# Altium integrated library Molex FFC - FPC Connectors (Through-Hole).IntLib: 219 symbols (part 3 of 3) (continued)
## 52806-2310
designator J?
1.0 mm Pitch FFC Connector, 5.4 mm Mated Height, Vertical, Non-ZIF, Through Hole, 23 Circuits, -20 to 80 degC, ELV and RoHS Compliant, Tray; Manufacturer: Molex; PartNumber: 52806-2310; Circuits (Loaded): 23; Current (Max per Contact): 0.5A; Durability (mating cycles max): 10; Mated Height: 5.40mm; Material - Metal: Phosphor Bronze; Material - Plating Mating: Tin; PCB Locator: No; PCB Retention: None; Pitch - Mating Interface: 1.00mm; Voltage (Max): 50V AC (RMS)/DC; PackageVersion: Rev. B, 08/2002; PackageReference: 52806-2310; PackageDescription: 23-Lead FFC Connector, Pitch 1.0 mm; Circuits (maximum): 23; Contact Position: N/A; Entry Angle: Vertical; Material - Plating Termination: Tin; Number of Rows: 1; Orientation: Vertical; Packing: Tray; Pitch - Termination Interface: 1.00mm; Polarized to PCB: No; RoHS: TRUE; Stackable: No; Mounting Technology: Through Hole; ComponentLink1Description: Manufacturer URL; ComponentLink1URL: http://www.molex.com/molex/index.jsp; ComponentLink2Description: Datasheet; ComponentLink2URL: http://www.molex.com/webdocs/datasheets/pdf/en-us/0528062310_FFC_FPC_CONNECTORS.pdf; ComponentLink3Description: Package Specification; ComponentLink3URL: http://www.molex.com/pdm_docs/sd/528062310_sd.pdf
footprint MOLX-52806-2310 (FFC Connector, 23-Leads, Vertical, Pitch 1.0 mm, Mated Height 5.4 mm, Through Hole)
pins: 1, 2, 3, 4, 5, 6, 7, 8, 9, 10, 11, 12, 13, 14, 15, 16, 17, 18, 19, 20, 21, 22, 23

## 52806-2410
designator J?
1.0 mm Pitch FFC Connector, 5.4 mm Mated Height, Vertical, Non-ZIF, Through Hole, 24 Circuits, -20 to 80 degC, ELV and RoHS Compliant, Tray; Manufacturer: Molex; PartNumber: 52806-2410; Circuits (Loaded): 24; Current (Max per Contact): 0.5A; Durability (mating cycles max): 10; Mated Height: 5.40mm; Material - Metal: Phosphor Bronze; Material - Plating Mating: Tin; PCB Locator: No; PCB Retention: None; Pitch - Mating Interface: 1.00mm; Voltage (Max): 50V AC (RMS)/DC; PackageVersion: Rev. B, 08/2002; PackageReference: 52806-2410; PackageDescription: 24-Lead FFC Connector, Pitch 1.0 mm; Circuits (maximum): 24; Contact Position: N/A; Entry Angle: Vertical; Material - Plating Termination: Tin; Number of Rows: 1; Orientation: Vertical; Packing: Tray; Pitch - Termination Interface: 1.00mm; Polarized to PCB: No; RoHS: TRUE; Stackable: No; Mounting Technology: Through Hole; ComponentLink1Description: Manufacturer URL; ComponentLink1URL: http://www.molex.com/molex/index.jsp; ComponentLink2Description: Datasheet; ComponentLink2URL: http://www.molex.com/webdocs/datasheets/pdf/en-us/0528062410_FFC_FPC_CONNECTORS.pdf; ComponentLink3Description: Package Specification; ComponentLink3URL: http://www.molex.com/pdm_docs/sd/528062410_sd.pdf
footprint MOLX-52806-2410 (FFC Connector, 24-Leads, Vertical, Pitch 1.0 mm, Mated Height 5.4 mm, Through Hole)
pins: 1, 2, 3, 4, 5, 6, 7, 8, 9, 10, 11, 12, 13, 14, 15, 16, 17, 18, 19, 20, 21, 22, 23, 24

## 52806-2510
designator J?
1.0 mm Pitch FFC Connector, 5.4 mm Mated Height, Vertical, Non-ZIF, Through Hole, 25 Circuits, -20 to 80 degC, ELV and RoHS Compliant, Tray; Manufacturer: Molex; PartNumber: 52806-2510; Circuits (Loaded): 25; Current (Max per Contact): 0.5A; Durability (mating cycles max): 10; Mated Height: 5.40mm; Material - Metal: Phosphor Bronze; Material - Plating Mating: Tin; PCB Locator: No; PCB Retention: None; Pitch - Mating Interface: 1.00mm; Voltage (Max): 50V AC (RMS)/DC; PackageVersion: Rev. B, 08/2002; PackageReference: 52806-2510; PackageDescription: 25-Lead FFC Connector, Pitch 1.0 mm; Circuits (maximum): 25; Contact Position: N/A; Entry Angle: Vertical; Material - Plating Termination: Tin; Number of Rows: 1; Orientation: Vertical; Packing: Tray; Pitch - Termination Interface: 1.00mm; Polarized to PCB: No; RoHS: TRUE; Stackable: No; Mounting Technology: Through Hole; ComponentLink1Description: Manufacturer URL; ComponentLink1URL: http://www.molex.com/molex/index.jsp; ComponentLink2Description: Datasheet; ComponentLink2URL: http://www.molex.com/webdocs/datasheets/pdf/en-us/0528062510_FFC_FPC_CONNECTORS.pdf; ComponentLink3Description: Package Specification; ComponentLink3URL: http://www.molex.com/pdm_docs/sd/528062510_sd.pdf
footprint MOLX-52806-2510 (FFC Connector, 25-Leads, Vertical, Pitch 1.0 mm, Mated Height 5.4 mm, Through Hole)
pins: 1, 2, 3, 4, 5, 6, 7, 8, 9, 10, 11, 12, 13, 14, 15, 16, 17, 18, 19, 20, 21, 22, 23, 24, 25

## 52806-2610
designator J?
1.0 mm Pitch FFC Connector, 5.4 mm Mated Height, Vertical, Non-ZIF, Through Hole, 26 Circuits, -20 to 80 degC, ELV and RoHS Compliant, Tray; Manufacturer: Molex; PartNumber: 52806-2610; Circuits (Loaded): 26; Current (Max per Contact): 0.5A; Durability (mating cycles max): 10; Mated Height: 5.40mm; Material - Metal: Phosphor Bronze; Material - Plating Mating: Tin; PCB Locator: No; PCB Retention: None; Pitch - Mating Interface: 1.00mm; Voltage (Max): 50V AC (RMS)/DC; PackageVersion: Rev. B, 08/2002; PackageReference: 52806-2610; PackageDescription: 26-Lead FFC Connector, Pitch 1.0 mm; Circuits (maximum): 26; Contact Position: N/A; Entry Angle: Vertical; Material - Plating Termination: Tin; Number of Rows: 1; Orientation: Vertical; Packing: Tray; Pitch - Termination Interface: 1.00mm; Polarized to PCB: No; RoHS: TRUE; Stackable: No; Mounting Technology: Through Hole; ComponentLink1Description: Manufacturer URL; ComponentLink1URL: http://www.molex.com/molex/index.jsp; ComponentLink2Description: Datasheet; ComponentLink2URL: http://www.molex.com/webdocs/datasheets/pdf/en-us/0528062610_FFC_FPC_CONNECTORS.pdf; ComponentLink3Description: Package Specification; ComponentLink3URL: http://www.molex.com/pdm_docs/sd/528062610_sd.pdf
footprint MOLX-52806-2610 (FFC Connector, 26-Leads, Vertical, Pitch 1.0 mm, Mated Height 5.4 mm, Through Hole)
pins: 1, 2, 3, 4, 5, 6, 7, 8, 9, 10, 11, 12, 13, 14, 15, 16, 17, 18, 19, 20, 21, 22, 23, 24, 25, 26

## 52806-2710
designator J?
1.0 mm Pitch FFC Connector, 5.4 mm Mated Height, Vertical, Non-ZIF, Through Hole, 27 Circuits, -20 to 80 degC, ELV and RoHS Compliant, Tray; Manufacturer: Molex; PartNumber: 52806-2710; Circuits (Loaded): 27; Current (Max per Contact): 0.5A; Durability (mating cycles max): 10; Mated Height: 5.40mm; Material - Metal: Phosphor Bronze; Material - Plating Mating: Tin; PCB Locator: No; PCB Retention: None; Pitch - Mating Interface: 1.00mm; Voltage (Max): 50V AC (RMS)/DC; PackageVersion: Rev. B, 08/2002; PackageReference: 52806-2710; PackageDescription: 27-Lead FFC Connector, Pitch 1.0 mm; Circuits (maximum): 27; Contact Position: N/A; Entry Angle: Vertical; Material - Plating Termination: Tin; Number of Rows: 1; Orientation: Vertical; Packing: Tray; Pitch - Termination Interface: 1.00mm; Polarized to PCB: No; RoHS: TRUE; Stackable: No; Mounting Technology: Through Hole; ComponentLink1Description: Manufacturer URL; ComponentLink1URL: http://www.molex.com/molex/index.jsp; ComponentLink2Description: Datasheet; ComponentLink2URL: http://www.molex.com/webdocs/datasheets/pdf/en-us/0528062710_FFC_FPC_CONNECTORS.pdf; ComponentLink3Description: Package Specification; ComponentLink3URL: http://www.molex.com/pdm_docs/sd/528062710_sd.pdf
footprint MOLX-52806-2710 (FFC Connector, 27-Leads, Vertical, Pitch 1.0 mm, Mated Height 5.4 mm, Through Hole)
pins: 1, 2, 3, 4, 5, 6, 7, 8, 9, 10, 11, 12, 13, 14, 15, 16, 17, 18, 19, 20, 21, 22, 23, 24, 25, 26, 27

## 52806-2810
designator J?
1.0 mm Pitch FFC Connector, 5.4 mm Mated Height, Vertical, Non-ZIF, Through Hole, 28 Circuits, -20 to 80 degC, ELV and RoHS Compliant, Tray; Manufacturer: Molex; PartNumber: 52806-2810; Circuits (Loaded): 28; Current (Max per Contact): 0.5A; Durability (mating cycles max): 10; Mated Height: 5.40mm; Material - Metal: Phosphor Bronze; Material - Plating Mating: Tin; PCB Locator: No; PCB Retention: None; Pitch - Mating Interface: 1.00mm; Voltage (Max): 50V AC (RMS)/DC; PackageVersion: Rev. B, 08/2002; PackageReference: 52806-2810; PackageDescription: 28-Lead FFC Connector, Pitch 1.0 mm; Circuits (maximum): 28; Contact Position: N/A; Entry Angle: Vertical; Material - Plating Termination: Tin; Number of Rows: 1; Orientation: Vertical; Packing: Tray; Pitch - Termination Interface: 1.00mm; Polarized to PCB: No; RoHS: TRUE; Stackable: No; Mounting Technology: Through Hole; ComponentLink1Description: Manufacturer URL; ComponentLink1URL: http://www.molex.com/molex/index.jsp; ComponentLink2Description: Datasheet; ComponentLink2URL: http://www.molex.com/webdocs/datasheets/pdf/en-us/0528062810_FFC_FPC_CONNECTORS.pdf; ComponentLink3Description: Package Specification; ComponentLink3URL: http://www.molex.com/pdm_docs/sd/528062810_sd.pdf
footprint MOLX-52806-2810 (FFC Connector, 28-Leads, Vertical, Pitch 1.0 mm, Mated Height 5.4 mm, Through Hole)
pins: 1, 2, 3, 4, 5, 6, 7, 8, 9, 10, 11, 12, 13, 14, 15, 16, 17, 18, 19, 20, 21, 22, 23, 24, 25, 26, 27, 28

## 52806-2910
designator J?
1.0 mm Pitch FFC Connector, 5.4 mm Mated Height, Vertical, Non-ZIF, Through Hole, 29 Circuits, -20 to 80 degC, ELV and RoHS Compliant, Tray; Manufacturer: Molex; PartNumber: 52806-2910; Circuits (Loaded): 29; Current (Max per Contact): 0.5A; Durability (mating cycles max): 10; Mated Height: 5.40mm; Material - Metal: Phosphor Bronze; Material - Plating Mating: Tin; PCB Locator: No; PCB Retention: None; Pitch - Mating Interface: 1.00mm; Voltage (Max): 50V AC (RMS)/DC; PackageVersion: Rev. B, 08/2002; PackageReference: 52806-2910; PackageDescription: 29-Lead FFC Connector, Pitch 1.0 mm; Circuits (maximum): 29; Contact Position: N/A; Entry Angle: Vertical; Material - Plating Termination: Tin; Number of Rows: 1; Orientation: Vertical; Packing: Tray; Pitch - Termination Interface: 1.00mm; Polarized to PCB: No; RoHS: TRUE; Stackable: No; Mounting Technology: Through Hole; ComponentLink1Description: Manufacturer URL; ComponentLink1URL: http://www.molex.com/molex/index.jsp; ComponentLink2Description: Datasheet; ComponentLink2URL: http://www.molex.com/webdocs/datasheets/pdf/en-us/0528062910_FFC_FPC_CONNECTORS.pdf; ComponentLink3Description: Package Specification; ComponentLink3URL: http://www.molex.com/pdm_docs/sd/528062910_sd.pdf
footprint MOLX-52806-2910 (FFC Connector, 29-Leads, Vertical, Pitch 1.0 mm, Mated Height 5.4 mm, Through Hole)
pins: 1, 2, 3, 4, 5, 6, 7, 8, 9, 10, 11, 12, 13, 14, 15, 16, 17, 18, 19, 20, 21, 22, 23, 24, 25, 26, 27, 28, 29

## 52806-3010
designator J?
1.0 mm Pitch FFC Connector, 5.4 mm Mated Height, Vertical, Non-ZIF, Through Hole, 30 Circuits, -20 to 80 degC, ELV and RoHS Compliant, Tray; Manufacturer: Molex; PartNumber: 52806-3010; Circuits (Loaded): 30; Current (Max per Contact): 0.5A; Durability (mating cycles max): 10; Mated Height: 5.40mm; Material - Metal: Phosphor Bronze; Material - Plating Mating: Tin; PCB Locator: No; PCB Retention: None; Pitch - Mating Interface: 1.00mm; Voltage (Max): 50V AC (RMS)/DC; PackageVersion: Rev. B, 08/2002; PackageReference: 52806-3010; PackageDescription: 30-Lead FFC Connector, Pitch 1.0 mm; Circuits (maximum): 30; Contact Position: N/A; Entry Angle: Vertical; Material - Plating Termination: Tin; Number of Rows: 1; Orientation: Vertical; Packing: Tray; Pitch - Termination Interface: 1.00mm; Polarized to PCB: No; RoHS: TRUE; Stackable: No; Mounting Technology: Through Hole; ComponentLink1Description: Manufacturer URL; ComponentLink1URL: http://www.molex.com/molex/index.jsp; ComponentLink2Description: Datasheet; ComponentLink2URL: http://www.molex.com/webdocs/datasheets/pdf/en-us/0528063010_FFC_FPC_CONNECTORS.pdf; ComponentLink3Description: Package Specification; ComponentLink3URL: http://www.molex.com/pdm_docs/sd/528063010_sd.pdf
footprint MOLX-52806-3010 (FFC Connector, 30-Leads, Vertical, Pitch 1.0 mm, Mated Height 5.4 mm, Through Hole)
pins: 1, 2, 3, 4, 5, 6, 7, 8, 9, 10, 11, 12, 13, 14, 15, 16, 17, 18, 19, 20, 21, 22, 23, 24, 25, 26, 27, 28, 29, 30

## 52807-0310
designator J?
1.0 mm Pitch FFC Connector, 3.6 mm Mated Height, Right Angle, Non-ZIF, Through Hole, Top Contact, 3 Circuits, -20 to 80 degC, ELV and RoHS Compliant, Tray; Manufacturer: Molex; PartNumber: 52807-0310; Circuits (Loaded): 3; Current (Max per Contact): 0.2A, 0.4A, 0.5A; Entry Angle: 90degrees Angle; Mated Height: 3.60mm; Material - Metal: Phosphor Bronze; Material - Plating Mating: Tin; PCB Retention: None; Pitch - Mating Interface: 1.00mm; Polarized to PCB: Yes; Stackable: No; Voltage (Max): 50V; PackageVersion: Rev. B, 08/2002; PackageReference: 52807-0310; PackageDescription: 3-Lead FFC Connector, Pitch 1.0 mm; Contact Position: Top; Material - Plating Termination: Tin; Number of Rows: 1; Orientation: Right Angle; Packing: Tray; Pitch - Termination Interface: 1.00mm; RoHS: TRUE; Mounting Technology: Through Hole; ComponentLink1Description: Manufacturer URL; ComponentLink1URL: http://www.molex.com/molex/index.jsp; ComponentLink2Description: Datasheet; ComponentLink2URL: http://www.molex.com/webdocs/datasheets/pdf/en-us/0528070310_FFC_FPC_CONNECTORS.pdf; ComponentLink3Description: Package Specification; ComponentLink3URL: http://www.molex.com/pdm_docs/sd/528070310_sd.pdf
footprint MOLX-52807-0310 (FFC Connector, 3-Leads, Right Angle, Pitch 1.0 mm, Mated Height 3.6 mm, Through Hole)
pins: 1, 2, 3

## 52807-0410
designator J?
1.0 mm Pitch FFC Connector, 3.6 mm Mated Height, Right Angle, Non-ZIF, Through Hole, Top Contact, 4 Circuits, -20 to 80 degC, ELV and RoHS Compliant, Tray; Manufacturer: Molex; PartNumber: 52807-0410; Circuits (Loaded): 4; Current (Max per Contact): 0.2A, 0.4A, 0.5A; Entry Angle: 90degrees Angle; Mated Height: 3.60mm; Material - Metal: Phosphor Bronze; Material - Plating Mating: Tin; PCB Retention: None; Pitch - Mating Interface: 1.00mm; Polarized to PCB: Yes; Stackable: No; Voltage (Max): 50V; PackageVersion: Rev. B, 08/2002; PackageReference: 52807-0410; PackageDescription: 4-Lead FFC Connector, Pitch 1.0 mm; Contact Position: Top; Material - Plating Termination: Tin; Number of Rows: 1; Orientation: Right Angle; Packing: Tray; Pitch - Termination Interface: 1.00mm; RoHS: TRUE; Mounting Technology: Through Hole; ComponentLink1Description: Manufacturer URL; ComponentLink1URL: http://www.molex.com/molex/index.jsp; ComponentLink2Description: Datasheet; ComponentLink2URL: http://www.molex.com/webdocs/datasheets/pdf/en-us/0528070410_FFC_FPC_CONNECTORS.pdf; ComponentLink3Description: Package Specification; ComponentLink3URL: http://www.molex.com/pdm_docs/sd/528070410_sd.pdf
footprint MOLX-52807-0410 (FFC Connector, 4-Leads, Right Angle, Pitch 1.0 mm, Mated Height 3.6 mm, Through Hole)
pins: 1, 2, 3, 4

## 52807-0510
designator J?
1.0 mm Pitch FFC Connector, 3.6 mm Mated Height, Right Angle, Non-ZIF, Through Hole, Top Contact, 5 Circuits, -20 to 80 degC, ELV and RoHS Compliant, Tray; Manufacturer: Molex; PartNumber: 52807-0510; Circuits (Loaded): 5; Current (Max per Contact): 0.2A, 0.4A, 0.5A; Entry Angle: 90degrees Angle; Mated Height: 3.60mm; Material - Metal: Phosphor Bronze; Material - Plating Mating: Tin; PCB Retention: None; Pitch - Mating Interface: 1.00mm; Polarized to PCB: Yes; Stackable: No; Voltage (Max): 50V; PackageVersion: Rev. B, 08/2002; PackageReference: 52807-0510; PackageDescription: 5-Lead FFC Connector, Pitch 1.0 mm; Contact Position: Top; Material - Plating Termination: Tin; Number of Rows: 1; Orientation: Right Angle; Packing: Tray; Pitch - Termination Interface: 1.00mm; RoHS: TRUE; Mounting Technology: Through Hole; ComponentLink1Description: Manufacturer URL; ComponentLink1URL: http://www.molex.com/molex/index.jsp; ComponentLink2Description: Datasheet; ComponentLink2URL: http://www.molex.com/webdocs/datasheets/pdf/en-us/0528070510_FFC_FPC_CONNECTORS.pdf; ComponentLink3Description: Package Specification; ComponentLink3URL: http://www.molex.com/pdm_docs/sd/528070510_sd.pdf
footprint MOLX-52807-0510 (FFC Connector, 5-Leads, Right Angle, Pitch 1.0 mm, Mated Height 3.6 mm, Through Hole)
pins: 1, 2, 3, 4, 5

## 52807-0610
designator J?
1.0 mm Pitch FFC Connector, 3.6 mm Mated Height, Right Angle, Non-ZIF, Through Hole, Top Contact, 6 Circuits, -20 to 80 degC, ELV and RoHS Compliant, Tray; Manufacturer: Molex; PartNumber: 52807-0610; Circuits (Loaded): 6; Current (Max per Contact): 0.2A, 0.4A, 0.5A; Entry Angle: 90degrees Angle; Mated Height: 3.60mm; Material - Metal: Phosphor Bronze; Material - Plating Mating: Tin; PCB Retention: None; Pitch - Mating Interface: 1.00mm; Polarized to PCB: Yes; Stackable: No; Voltage (Max): 50V; PackageVersion: Rev. B, 08/2002; PackageReference: 52807-0610; PackageDescription: 6-Lead FFC Connector, Pitch 1.0 mm; Contact Position: Top; Material - Plating Termination: Tin; Number of Rows: 1; Orientation: Right Angle; Packing: Tray; Pitch - Termination Interface: 1.00mm; RoHS: TRUE; Mounting Technology: Through Hole; ComponentLink1Description: Manufacturer URL; ComponentLink1URL: http://www.molex.com/molex/index.jsp; ComponentLink2Description: Datasheet; ComponentLink2URL: http://www.molex.com/webdocs/datasheets/pdf/en-us/0528070610_FFC_FPC_CONNECTORS.pdf; ComponentLink3Description: Package Specification; ComponentLink3URL: http://www.molex.com/pdm_docs/sd/528070610_sd.pdf
footprint MOLX-52807-0610 (FFC Connector, 6-Leads, Right Angle, Pitch 1.0 mm, Mated Height 3.6 mm, Through Hole)
pins: 1, 2, 3, 4, 5, 6

## 52807-0710
designator J?
1.0 mm Pitch FFC Connector, 3.6 mm Mated Height, Right Angle, Non-ZIF, Through Hole, Top Contact, 7 Circuits, -20 to 80 degC, ELV and RoHS Compliant, Tray; Manufacturer: Molex; PartNumber: 52807-0710; Circuits (Loaded): 7; Current (Max per Contact): 0.2A, 0.4A, 0.5A; Entry Angle: 90degrees Angle; Mated Height: 3.60mm; Material - Metal: Phosphor Bronze; Material - Plating Mating: Tin; PCB Retention: None; Pitch - Mating Interface: 1.00mm; Polarized to PCB: Yes; Stackable: No; Voltage (Max): 50V; PackageVersion: Rev. B, 08/2002; PackageReference: 52807-0710; PackageDescription: 7-Lead FFC Connector, Pitch 1.0 mm; Contact Position: Top; Material - Plating Termination: Tin; Number of Rows: 1; Orientation: Right Angle; Packing: Tray; Pitch - Termination Interface: 1.00mm; RoHS: TRUE; Mounting Technology: Through Hole; ComponentLink1Description: Manufacturer URL; ComponentLink1URL: http://www.molex.com/molex/index.jsp; ComponentLink2Description: Datasheet; ComponentLink2URL: http://www.molex.com/webdocs/datasheets/pdf/en-us/0528070710_FFC_FPC_CONNECTORS.pdf; ComponentLink3Description: Package Specification; ComponentLink3URL: http://www.molex.com/pdm_docs/sd/528070710_sd.pdf
footprint MOLX-52807-0710 (FFC Connector, 7-Leads, Right Angle, Pitch 1.0 mm, Mated Height 3.6 mm, Through Hole)
pins: 1, 2, 3, 4, 5, 6, 7

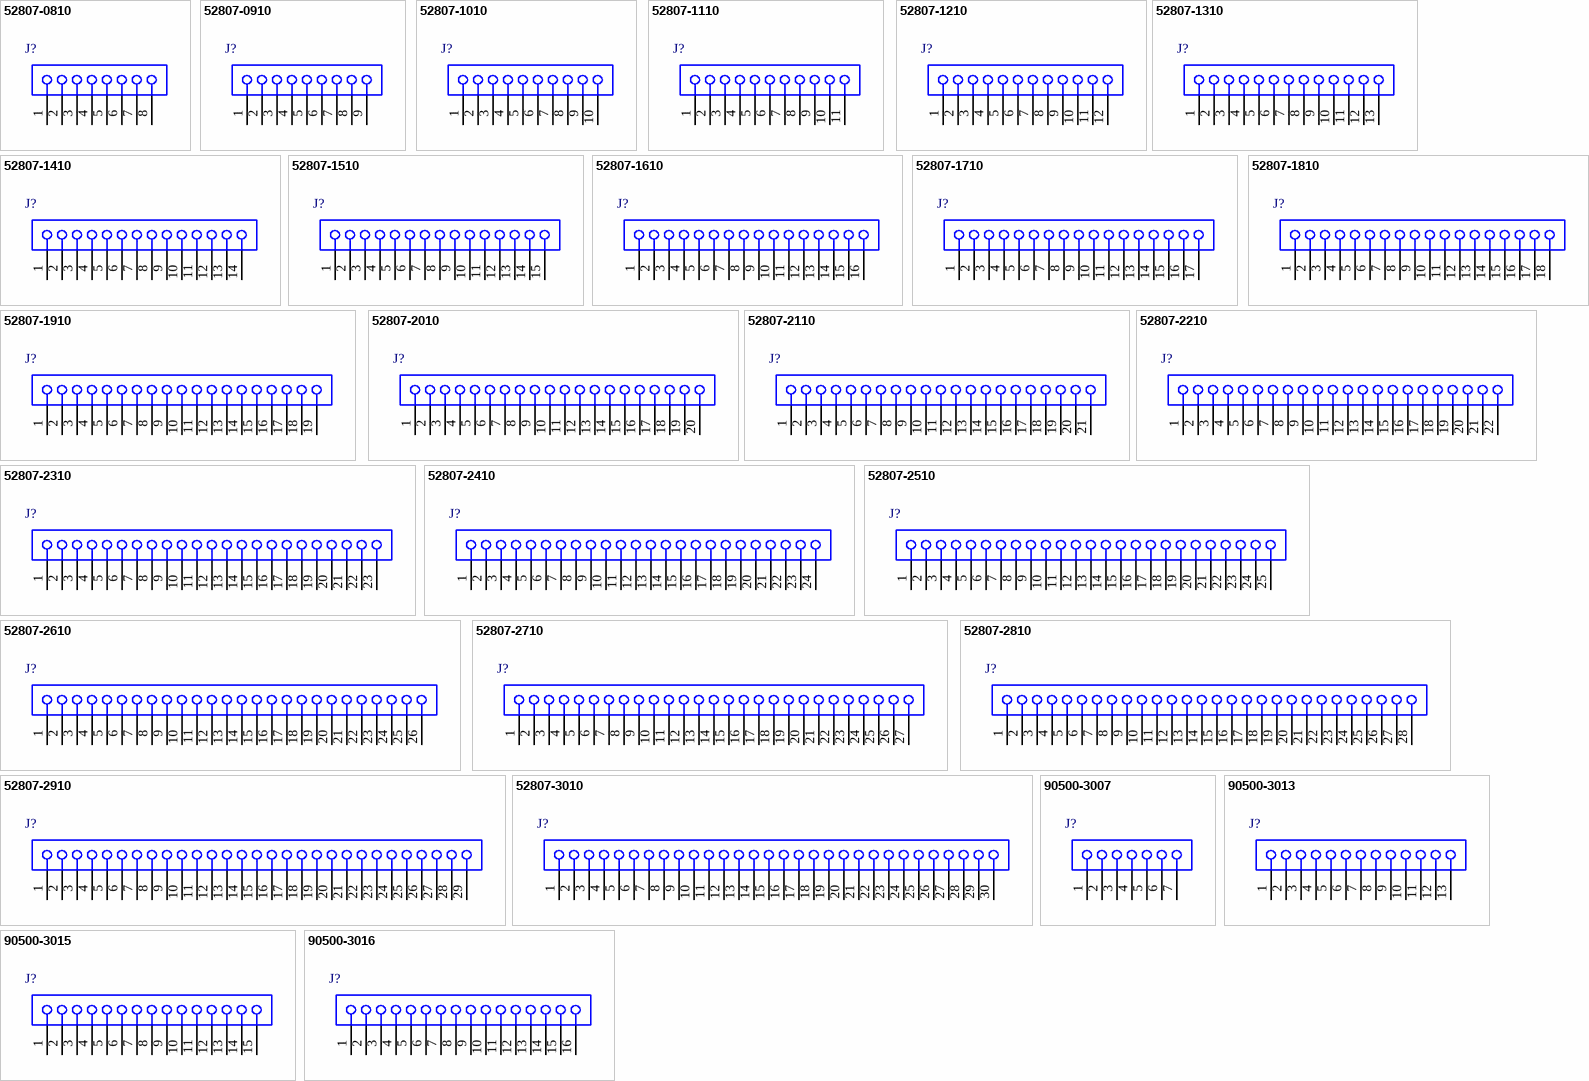
[diagram p5: symbols 52807-0810 to 90500-3016]

## 52807-0810
designator J?
1.0 mm Pitch FFC Connector, 3.6 mm Mated Height, Right Angle, Non-ZIF, Through Hole, Top Contact, 8 Circuits, -20 to 80 degC, ELV and RoHS Compliant, Tray; Manufacturer: Molex; PartNumber: 52807-0810; Circuits (Loaded): 8; Current (Max per Contact): 0.2A, 0.4A, 0.5A; Entry Angle: 90degrees Angle; Mated Height: 3.60mm; Material - Metal: Phosphor Bronze; Material - Plating Mating: Tin; PCB Retention: None; Pitch - Mating Interface: 1.00mm; Polarized to PCB: Yes; Stackable: No; Voltage (Max): 50V; PackageVersion: Rev. B, 08/2002; PackageReference: 52807-0810; PackageDescription: 8-Lead FFC Connector, Pitch 1.0 mm; Contact Position: Top; Material - Plating Termination: Tin; Number of Rows: 1; Orientation: Right Angle; Packing: Tray; Pitch - Termination Interface: 1.00mm; RoHS: TRUE; Mounting Technology: Through Hole; ComponentLink1Description: Manufacturer URL; ComponentLink1URL: http://www.molex.com/molex/index.jsp; ComponentLink2Description: Datasheet; ComponentLink2URL: http://www.molex.com/webdocs/datasheets/pdf/en-us/0528070810_FFC_FPC_CONNECTORS.pdf; ComponentLink3Description: Package Specification; ComponentLink3URL: http://www.molex.com/pdm_docs/sd/528070810_sd.pdf
footprint MOLX-52807-0810 (FFC Connector, 8-Leads, Right Angle, Pitch 1.0 mm, Mated Height 3.6 mm, Through Hole)
pins: 1, 2, 3, 4, 5, 6, 7, 8

## 52807-0910
designator J?
1.0 mm Pitch FFC Connector, 3.6 mm Mated Height, Right Angle, Non-ZIF, Through Hole, Top Contact, 9 Circuits, -20 to 80 degC, ELV and RoHS Compliant, Tray; Manufacturer: Molex; PartNumber: 52807-0910; Circuits (Loaded): 9; Current (Max per Contact): 0.2A, 0.4A, 0.5A; Entry Angle: 90degrees Angle; Mated Height: 3.60mm; Material - Metal: Phosphor Bronze; Material - Plating Mating: Tin; PCB Retention: None; Pitch - Mating Interface: 1.00mm; Polarized to PCB: Yes; Stackable: No; Voltage (Max): 50V; PackageVersion: Rev. B, 08/2002; PackageReference: 52807-0910; PackageDescription: 9-Lead FFC Connector, Pitch 1.0 mm; Contact Position: Top; Material - Plating Termination: Tin; Number of Rows: 1; Orientation: Right Angle; Packing: Tray; Pitch - Termination Interface: 1.00mm; RoHS: TRUE; Mounting Technology: Through Hole; ComponentLink1Description: Manufacturer URL; ComponentLink1URL: http://www.molex.com/molex/index.jsp; ComponentLink2Description: Datasheet; ComponentLink2URL: http://www.molex.com/webdocs/datasheets/pdf/en-us/0528070910_FFC_FPC_CONNECTORS.pdf; ComponentLink3Description: Package Specification; ComponentLink3URL: http://www.molex.com/pdm_docs/sd/528070910_sd.pdf
footprint MOLX-52807-0910 (FFC Connector, 9-Leads, Right Angle, Pitch 1.0 mm, Mated Height 3.6 mm, Through Hole)
pins: 1, 2, 3, 4, 5, 6, 7, 8, 9

## 52807-1010
designator J?
1.0 mm Pitch FFC Connector, 3.6 mm Mated Height, Right Angle, Non-ZIF, Through Hole, Top Contact, 10 Circuits, -20 to 80 degC, ELV and RoHS Compliant, Tray; Manufacturer: Molex; PartNumber: 52807-1010; Circuits (Loaded): 10; Current (Max per Contact): 0.2A, 0.4A, 0.5A; Entry Angle: 90degrees Angle; Mated Height: 3.60mm; Material - Metal: Phosphor Bronze; Material - Plating Mating: Tin; PCB Retention: None; Pitch - Mating Interface: 1.00mm; Polarized to PCB: Yes; Stackable: No; Voltage (Max): 50V; PackageVersion: Rev. B, 08/2002; PackageReference: 52807-1010; PackageDescription: 10-Lead FFC Connector, Pitch 1.0 mm; Contact Position: Top; Material - Plating Termination: Tin; Number of Rows: 1; Orientation: Right Angle; Packing: Tray; Pitch - Termination Interface: 1.00mm; RoHS: TRUE; Mounting Technology: Through Hole; ComponentLink1Description: Manufacturer URL; ComponentLink1URL: http://www.molex.com/molex/index.jsp; ComponentLink2Description: Datasheet; ComponentLink2URL: http://www.molex.com/webdocs/datasheets/pdf/en-us/0528071010_FFC_FPC_CONNECTORS.pdf; ComponentLink3Description: Package Specification; ComponentLink3URL: http://www.molex.com/pdm_docs/sd/528071010_sd.pdf
footprint MOLX-52807-1010 (FFC Connector, 10-Leads, Right Angle, Pitch 1.0 mm, Mated Height 3.6 mm, Through Hole)
pins: 1, 2, 3, 4, 5, 6, 7, 8, 9, 10

## 52807-1110
designator J?
1.0 mm Pitch FFC Connector, 3.6 mm Mated Height, Right Angle, Non-ZIF, Through Hole, Top Contact, 11 Circuits, -20 to 80 degC, ELV and RoHS Compliant, Tray; Manufacturer: Molex; PartNumber: 52807-1110; Circuits (Loaded): 11; Current (Max per Contact): 0.2A, 0.4A, 0.5A; Entry Angle: 90degrees Angle; Mated Height: 3.60mm; Material - Metal: Phosphor Bronze; Material - Plating Mating: Tin; PCB Retention: None; Pitch - Mating Interface: 1.00mm; Polarized to PCB: Yes; Stackable: No; Voltage (Max): 50V; PackageVersion: Rev. B, 08/2002; PackageReference: 52807-1110; PackageDescription: 11-Lead FFC Connector, Pitch 1.0 mm; Contact Position: Top; Material - Plating Termination: Tin; Number of Rows: 1; Orientation: Right Angle; Packing: Tray; Pitch - Termination Interface: 1.00mm; RoHS: TRUE; Mounting Technology: Through Hole; ComponentLink1Description: Manufacturer URL; ComponentLink1URL: http://www.molex.com/molex/index.jsp; ComponentLink2Description: Datasheet; ComponentLink2URL: http://www.molex.com/webdocs/datasheets/pdf/en-us/0528071110_FFC_FPC_CONNECTORS.pdf; ComponentLink3Description: Package Specification; ComponentLink3URL: http://www.molex.com/pdm_docs/sd/528071110_sd.pdf
footprint MOLX-52807-1110 (FFC Connector, 11-Leads, Right Angle, Pitch 1.0 mm, Mated Height 3.6 mm, Through Hole)
pins: 1, 2, 3, 4, 5, 6, 7, 8, 9, 10, 11

## 52807-1210
designator J?
1.0 mm Pitch FFC Connector, 3.6 mm Mated Height, Right Angle, Non-ZIF, Through Hole, Top Contact, 12 Circuits, -20 to 80 degC, ELV and RoHS Compliant, Tray; Manufacturer: Molex; PartNumber: 52807-1210; Circuits (Loaded): 12; Current (Max per Contact): 0.2A, 0.4A, 0.5A; Entry Angle: 90degrees Angle; Mated Height: 3.60mm; Material - Metal: Phosphor Bronze; Material - Plating Mating: Tin; PCB Retention: None; Pitch - Mating Interface: 1.00mm; Polarized to PCB: Yes; Stackable: No; Voltage (Max): 50V; PackageVersion: Rev. B, 08/2002; PackageReference: 52807-1210; PackageDescription: 12-Lead FFC Connector, Pitch 1.0 mm; Contact Position: Top; Material - Plating Termination: Tin; Number of Rows: 1; Orientation: Right Angle; Packing: Tray; Pitch - Termination Interface: 1.00mm; RoHS: TRUE; Mounting Technology: Through Hole; ComponentLink1Description: Manufacturer URL; ComponentLink1URL: http://www.molex.com/molex/index.jsp; ComponentLink2Description: Datasheet; ComponentLink2URL: http://www.molex.com/webdocs/datasheets/pdf/en-us/0528071210_FFC_FPC_CONNECTORS.pdf; ComponentLink3Description: Package Specification; ComponentLink3URL: http://www.molex.com/pdm_docs/sd/528071210_sd.pdf
footprint MOLX-52807-1210 (FFC Connector, 12-Leads, Right Angle, Pitch 1.0 mm, Mated Height 3.6 mm, Through Hole)
pins: 1, 2, 3, 4, 5, 6, 7, 8, 9, 10, 11, 12
